# Altium footprint library Horizont_11_12_2017.PcbLib: 257 footprints (part 11 of 17)
Each footprint in its own frame and in the unit in brackets; x right, y up, seen from the top. Pads: shape width x height; smd on the part's side, far side on the other; paste and mask are expansions set on the pad; w line width, h text height; cw(c..) or ccw(c..) is an arc to the next point about the centre after c.
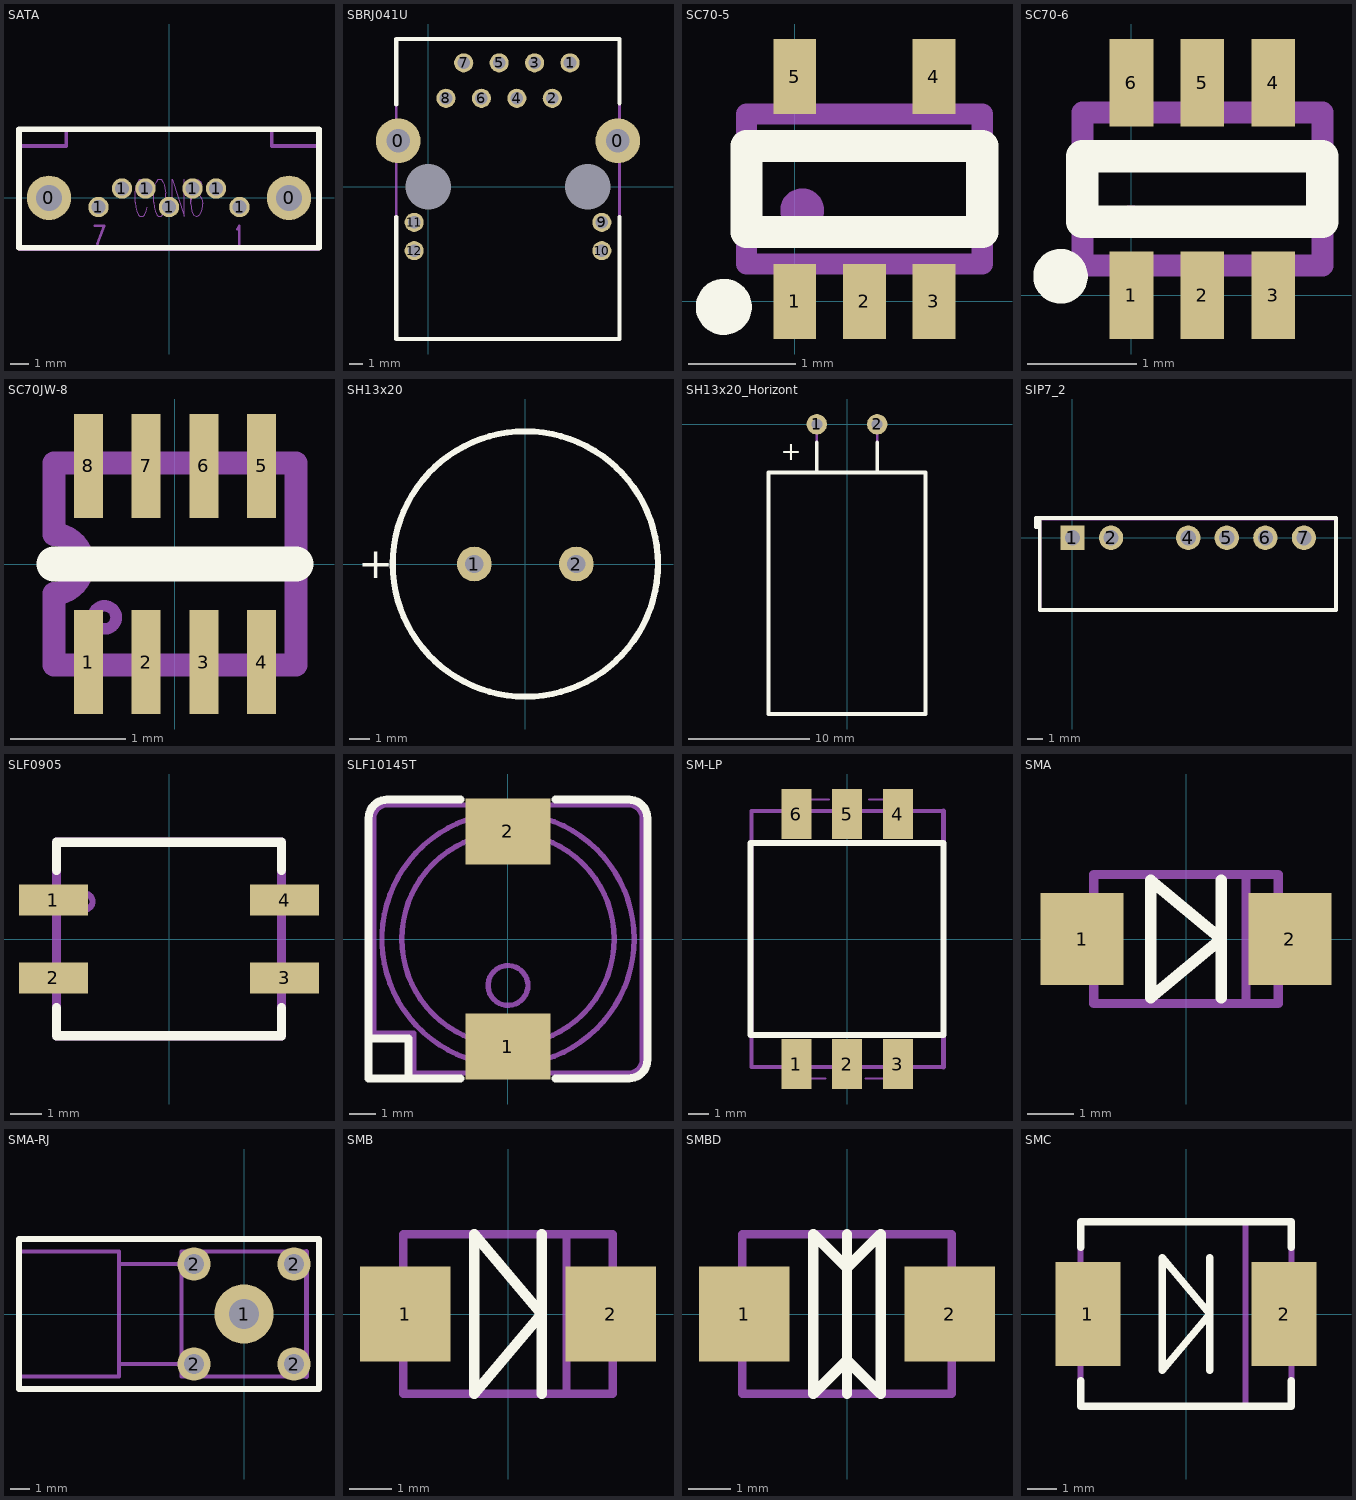
[diagram p10: the footprints below, top view; thin cyan lines are the x and y axes]

## SATA [mm]
height 8.4
pads (9):
  round 2.4 hole 1.4 mask+0.05: 0(-6.48,0) 0(6.48,0)
  round 1.1 hole 0.75 mask+0.05: 1(-3.81,-0.5) 1(-2.54,0.5) 1(-1.27,0.5) 1(0,-0.5) 1(1.27,0.5) 1(2.54,0.5) 1(3.81,-0.5)
Top Overlay:
  lines w0.3: -8.1,-2.7 -8.1,3.7 8.1,3.7 8.1,-2.7 -8.1,-2.7
Mechanical 1:
  lines w0.2: -8.1,-2.7 8.1,-2.7 8.1,2.8 5.548,2.8 5.548,3.7 3.15,3.7 -4.4,3.7 -5.552,3.7 -5.552,2.8 -5.553,2.8 -8.1,2.8 -8.1,-2.7
  text "7" at -4.08,0.7 h1.5
  text "1" at 3.82,0.5 h1.5
  text ".Designator" at -2.5,-2.8 h1.5
Mechanical 7:
  lines w0.05: -1.177,-0.516 -1.223,-0.728 -1.314,-0.91 -1.398,-1 -1.574,-1 -1.658,-0.91 -1.743,-0.728 -1.788,-0.516 -1.827,-0.243 -1.827,0.242 -1.788,0.515 -1.743,0.697 -1.658,0.878 -1.574,1 -1.398,1 -1.314,0.878 -1.223,0.697 -1.177,0.515 ; 0.173,-1 0.173,1 0.823,-1 0.823,1 ; 1.771,0.697 1.719,0.878 1.569,0.969 1.472,0.969 1.322,0.878 1.218,0.606 1.173,0.121 1.173,-0.334 ; 1.173,-0.334 1.218,-0.061 1.322,0.121 1.472,0.212 1.517,0.212 1.667,0.121 1.771,-0.061 1.823,-0.334 1.823,-0.455 1.771,-0.728 1.667,-0.91 1.517,-1 1.472,-1 1.322,-0.91 1.218,-0.728 1.173,-0.334 ; -0.827,-0.243 -0.788,-0.516 -0.749,-0.728 -0.665,-0.91 -0.587,-1 -0.424,-1 -0.346,-0.91 -0.262,-0.728 -0.223,-0.516 -0.177,-0.243 -0.177,0.242 -0.223,0.515 -0.262,0.697 -0.346,0.878 -0.424,1 -0.587,1 -0.665,0.878 -0.749,0.697 -0.788,0.515 -0.827,0.242 -0.827,-0.243
  lines w0.15: -4.012,-1.516 -3.492,-1.516 -3.867,-2.5 ; 3.691,-1.697 3.732,-1.652 3.795,-1.516 3.795,-2.5 ; -8.052,-2.8 8.048,-2.8 8.048,2.8 5.548,2.8 5.548,3.75 -5.552,3.75 -5.552,2.8 -8.052,2.8 -8.052,-2.8
3D body "SATA.stp": height 8, standoff -2.8, extent -8.04,-2.75 8.04,3.7

## SBRJ041U [mm]
height 13.5
pads (16):
  round 3.205 hole 1.7 mask+0.097: 0(-2.16,3.3) 0(13.59,3.3)
  round 0 hole 3.25 mask+2: 0(0,0)
  round 0.2 hole 3.25 mask+2: 0(11.43,0)
  round 1.372 hole 0.9 mask+0.051: 1(10.16,8.89) 2(8.89,6.35) 3(7.62,8.89) 4(6.35,6.35) 5(5.08,8.89) 6(3.81,6.35) 7(2.54,8.89) 8(1.27,6.35) 9(12.44,-2.54) 10(12.44,-4.57) 11(-1.01,-2.54) 12(-1.01,-4.57)
Top Overlay:
  lines w0.3: -2.287,-2.15 -2.287,-10.9 13.713,-10.9 13.713,-2.15 ; -2.287,5.9 -2.287,10.6 13.713,10.6 13.713,6
Mechanical 1:
  lines w0.2: -2.287,-10.9 13.713,-10.9 13.713,10.6 -2.287,10.6 -2.287,-10.9
  text "8" at -0.337,6 h1.5
  text "7" at 0.863,8.6 h1.5
  text "2" at 10.013,5.95 h1.5
  text "1" at 11.213,8.5 h1.5
  text ".Designator" at 3.363,-5.35 h1.5
3D body "SBRJ041U.STEP": height 13.02, standoff -4.01, extent -2.285,-10.9 13.715,10.6

## SC70-5 [mm]
height 1.1
pads (5):
  rect 0.4x0.7 smd: 1(0,0) 2(0.65,0) 3(1.3,0) 4(1.3,2.1) 5(0,2.1)
Top Overlay:
  circle w0.3: c-0.662,-0.05 r0.112
  lines w0.3: -0.45,0.65 -0.45,1.45 1.75,1.45 1.75,0.65 -0.45,0.65
Mechanical 1:
  circle w0.25: c0.07,0.85 r0.08
  lines w0.2: 0,-0.15 0,0.35 ; 0,1.75 0,2.25 ; 1.3,-0.15 1.3,0.35 ; 1.3,1.75 1.3,2.25 ; -0.45,0.35 1.75,0.35 1.75,1.75 -0.45,1.75 -0.45,0.35 ; 0.65,-0.15 0.65,0.35 0.65,-0.15
  text ".Designator" at -0.32,2.91 h1.5
  text ".Comment" at -2.02,-1.69 h1.5
  text "5" at -1.05,2.05 h1.5
3D body "DCK.stp": height 1.11, standoff 0, extent -0.45,-0.25 1.75,2.35

## SC70-6 [mm]
height 0.9
pads (6):
  rect 0.4x0.8 smd: 1(0,0) 2(0.65,0) 3(1.3,0) 4(1.3,1.95) 5(0.65,1.95) 6(0,1.95)
Top Overlay:
  circle w0.3: c-0.65,0.175 r0.1
  lines w0.3: -0.45,0.675 1.75,0.675 1.75,1.275 -0.45,1.275 -0.45,0.675
Mechanical 1:
  circle w0.2: c0,0.675 r0.05
  lines w0.2: 0,-0.225 0,0.275 ; 0,1.675 0,2.175 ; 0.65,-0.225 0.65,0.275 ; 0.65,1.675 0.65,2.175 ; 1.3,-0.225 1.3,0.275 ; 1.3,1.675 1.3,2.175 ; -0.45,0.275 -0.45,1.675 1.75,1.675 1.75,0.275 -0.45,0.275
  text "6" at -1.05,1.975 h1.5
  text ".Comment" at -1.89,-1.62 h1.5
  text ".Designator" at -0.09,2.65 h1.5
3D body "KS6h09.stp": height 0.91, standoff 0, extent -0.45,-0.13 1.75,2.07

## SC70JW-8 [mm]
height 1.1
pads (8):
  rect 0.25x0.9 smd: 1(-0.75,-0.85) 2(-0.25,-0.85) 3(0.25,-0.85) 4(0.75,-0.85) 5(0.75,0.85) 6(0.25,0.85) 7(-0.25,0.85) 8(-0.75,0.85)
Top Overlay:
  lines w0.3: -1.05,0 1.05,0
Mechanical 1:
  circle w0.1: c-0.61,-0.463 r0.1
  lines w0.2: -1.05,-0.875 -1.05,-0.254 ccw(c-1.05,0) -1.05,0.254 -1.05,0.875 1.05,0.875 1.05,-0.875 -1.05,-0.875
  text ".Designator" at -0.3,1.35 h1.5
  text "8" at -1.25,1.2 h1.5
3D body "SC70JW-8.STEP": height 1.1, standoff 0, extent -1.1,-1.15 1.1,1.15

## SH13x20 [mm]
height 20
pads (2):
  round 1.7 hole 0.9: 1(-2.5,0) 2(2.5,0)
Top Overlay:
  circle w0.3: c0,0 r6.5
  text "+" at -8.2,-0.7 h1.5
Mechanical 1:
  circle w0.2: c0,0 r6.5
  text ".Designator" at -1.27,2.54 h1.5
  text "+" at -2.9,-0.5 h1.5
3D body "SH13x20.STEP": height 20, standoff -3, extent -6.5,-6.5 6.5,6.5

## SH13x20_Horizont [mm]
height 13
pads (2):
  round 1.7 hole 0.9: 1(-2.5,0) 2(2.5,0)
Top Overlay:
  lines w0.3: -2.5,-4 -2.5,-1.5 ; 2.5,-4 2.5,-1.5 ; -6.5,-24 6.5,-24 6.5,-4 -6.5,-4 -6.5,-24
  text "+" at -5.5,-3 h1.5
Mechanical 1:
  lines w0.2: -2.5,-4 -2.5,0 ; 2.5,-4 2.5,0 ; -6.5,-24 -6.5,-4 6.5,-4 6.5,-24 -6.5,-24
  text ".Designator" at -2,-8 h1.5
  text "+" at -3,-5.5 h1.5
3D body "SH13x20_Horizont.STEP": height 13, standoff -3, extent -6.5,-24 6.5,0.3

## SIP7_2 [mm]
height 10
pads (6):
  rect 1.6x1.6 hole 1: 1(0,0)
  round 1.6 hole 1: 2(2.54,0) 4(7.62,0) 5(10.16,0) 6(12.7,0) 7(15.24,0)
Top Overlay:
  lines w0.25: -2.15,0.7 -2.4,0.7 -2.4,1.3 -2,1.3 ; -2.15,-4.75 -2.15,1.3 -0.1,1.3 17.35,1.3 17.35,-4.75 -2.15,-4.75
Mechanical 1:
  lines w0.2: -2.15,-4.75 -2.15,1.25 17.35,1.25 17.35,-4.75 -2.15,-4.75
  text "1" at -0.2,-0.4 h1.5
  text "7" at 15.24,-0.381 h1.5
  text ".Comment" at 5.15,-3.7 h1.5
  text ".Designator" at 4.5,-2.1 h1.5
3D body "SIP7_2.stp": height 10, standoff -3, extent -2.15,-4.75 17.35,1.25

## SLF0905 [mm]
height 5.55
pads (4):
  rect 2.2x1 smd: 1(-3.7,1.245) 2(-3.7,-1.245) 3(3.7,-1.245) 4(3.7,1.245)
Top Overlay:
  lines w0.3: -3.6,-2.2 -3.6,-3.1 3.6,-3.1 3.6,-2.2 ; -3.6,2.2 -3.6,3.1 3.6,3.1 3.6,2.2
Mechanical 1:
  circle w0.2: c-2.7,1.197 r0.254
  lines w0.3: -4.6,-1.2 -3.6,-1.2 ; -4.6,1.2 -3.6,1.2 ; 3.6,-1.2 4.6,-1.2 ; 3.6,1.2 4.6,1.2 ; -3.6,-3.1 3.6,-3.1 3.6,3.1 -3.6,3.1 -3.6,-3.1
  text ".Designator" at -1.5,0.2 h1.5
  text ".Comment" at -2.21,-1.92 h1.5
3D body "SLF0905.stp": height 5.65, standoff 0.1, extent -4.595,-3.1 4.595,3.1

## SLF10145T [mm]
height 5
pads (2):
  rect 3.2x2.5 smd: 1(0,-4.05) 2(0,4.05)
Top Overlay:
  lines w0.3: -5.25,-3.75 -3.75,-3.75 -3.75,-5.25 ; -1.794,-5.25 -5.25,-5.25 -5.25,4.55 cw(c-4.55,4.55) -4.55,5.25 -1.794,5.25 ; 1.794,-5.25 4.55,-5.25 ccw(c4.55,-4.55) 5.25,-4.55 5.25,4.55 ccw(c4.55,4.55) 4.55,5.25 1.794,5.25
Mechanical 1:
  circle w0.2: c0,0 r4.75
  circle w0.2: c0,0 r4
  circle w0.2: c0,-1.75 r0.75
  lines w0.2: -5.05,-3.55 -5.05,4.55 cw(c-4.55,4.55) -4.55,5.05 4.55,5.05 cw(c4.55,4.55) 5.05,4.55 5.05,-4.55 cw(c4.55,-4.55) 4.55,-5.05 -3.55,-5.05 -3.55,-3.55 -5.05,-3.55
  text ".Comment" at -1.35,-0.2 h1.5
  text ".Designator" at -2,1.4 h1.5
3D body "SLF10145T.stp": height 5.06, standoff 0, extent -5,-5 5,5

## SM-LP [mm]
height 7.36
pads (6):
  rect 1.5x2.5 smd: 1(-2.54,-6.25) 2(0,-6.25) 3(2.54,-6.25) 4(2.54,6.25) 5(0,6.25) 6(-2.54,6.25)
Top Overlay:
  lines w0.3: -4.83,-4.8 4.81,-4.8 4.81,4.8 -4.83,4.8 -4.83,-4.8
Mechanical 1:
  circle w0.1: c-2.55,-5.8 r0.1
  lines w0.1: -2.59,-6.98 -1.09,-6.98 ; -2.51,6.98 -0.91,6.98 ; -0.24,-7 0.014,-7 ; -0.014,7 0.24,7 ; 0.91,-6.98 2.51,-6.98 ; 1.09,6.98 2.59,6.98
  lines w0.2: -2.59,-6.98 -2.59,-6.4 ; -2.51,6.4 -2.51,6.98 ; 2.51,-6.98 2.51,-6.4 ; 2.59,6.4 2.59,6.98 ; 4.81,-6.4 -4.79,-6.4 -4.79,6.4 4.81,6.4
  lines w0.25: 4.81,-6.4 4.81,6.4
  text "6" at -2.7,5.15 h1.5
  text ".Comment" at -2.75,-2.25 h1.5
  text ".Designator" at -1.75,1.5 h1.5
3D body "SM-LP.STEP": height 5.02, standoff 0, extent -4.8,-7 4.8,7

## SMA [mm]
height 2.2
pads (2):
  rect 1.8x2 smd: 1(-2.25,0) 2(2.25,0)
Top Overlay:
  lines w0.25: 0.762,-1.27 0.762,1.27 ; -0.762,-1.27 0.762,0 -0.762,1.27 -0.762,-1.27
Mechanical 1:
  lines w0.2: -2,-0.8 -2.7,-0.8 -2.7,0.8 -2,0.8 ; 1.3,-1.27 1.3,1.27 ; 2,-0.8 2.7,-0.8 2.7,0.8 2,0.8 ; -2,-1.4 2,-1.4 2,1.4 -2,1.4 -2,-1.4
  text "+" at -1.338,0.108 h1.5
  text ".Designator" at -1.3,1.8 h1.5
3D body "SMA.stp": height 2.2, standoff 0, extent -2.8,-1.5 2.8,1.5

## SMA-RJ [mm]
height 9.9
pads (5):
  round 3 hole 1.5: 1(0,0)
  round 1.7 hole 1: 2(-2.54,-2.54) 2(-2.54,2.54) 2(2.54,-2.54) 2(2.54,2.54)
Top Overlay:
  lines w0.3: -11.43,-3.81 -11.43,3.81 3.81,3.81 3.81,-3.81 -11.43,-3.81
Mechanical 1:
  lines w0.2: -6.35,-2.54 -3.175,-2.54 ; -6.35,2.54 -3.175,2.54 ; 3.175,-3.175 -3.175,-3.175 -3.175,3.175 3.175,3.175 ; -11.43,-3.175 -6.35,-3.175 -6.35,3.175 -11.43,3.175 -11.43,-3.175
  lines w0.25: 3.175,-3.175 3.175,3.175
  text ".Designator" at -1.05,0.51 h1.5
  text ".Comment" at -1.27,-4.445 h1.5
3D body "SW3dPS-sma ra pcb mount molex.STEP": height 9.55, standoff -3.94, extent -11.633,-3.175 3.175,3.175

## SMB [mm]
height 2.44
pads (2):
  rect 2.16x2.26 smd: 1(-2.45,0) 2(2.45,0)
Top Overlay:
  lines w0.25: 0.8,-1.9 0.8,1.9 ; -0.8,-1.9 0.8,0 -0.8,1.9 -0.8,-1.9
Mechanical 1:
  lines w0.2: -2.5,-1.016 -3,-1.016 -3,1.016 -2.5,1.016 ; 1.397,-1.778 1.397,1.778 ; 2.5,-1.016 3,-1.016 3,1.016 2.5,1.016 ; -2.5,-1.9 2.5,-1.9 2.5,1.9 -2.5,1.9 -2.5,-1.9
  text "+" at -1.238,0.008 h1.5
  text ".Designator" at -1.4,2.5 h1.5
3D body "SMB.stp": height 2.4, standoff 0, extent -3,-1.9 3,1.91

## SMBD [mm]
height 2.44
pads (2):
  rect 2.16x2.26 smd: 1(-2.45,0) 2(2.45,0)
Top Overlay:
  lines w0.25: 0,-1.9 0,1.9 ; 0,-1.1 0.8,-1.9 0.8,1.9 0,1.1 ; 0,-1.1 0,0 0,1.1 ; 0,-1.1 -0.8,-1.9 -0.8,1.9 0,1.1
Mechanical 1:
  lines w0.2: -2.5,-1.016 -3,-1.016 -3,1.016 -2.5,1.016 ; 2.5,-1.016 3,-1.016 3,1.016 2.5,1.016 ; -2.5,-1.9 -2.5,1.9 2.5,1.9 2.5,-1.9 -2.5,-1.9
  text ".Designator" at -1.4,2.5 h1.5
  text "+" at -1.238,0.008 h1.5
3D body "SMB.stp": height 2.4, standoff 0, extent -3,-1.9 3,1.91

## SMC [mm]
height 2.62
pads (2):
  rect 2.2x3.5 smd: 1(-3.3,0) 2(3.3,0)
Top Overlay:
  lines w0.25: -3.55,-2.25 -3.55,-3.1 3.55,-3.1 3.55,-2.25 ; -3.55,2.25 -3.55,3.1 3.55,3.1 3.55,2.25 ; 0.8,-1.9 0.8,1.9 ; -0.8,-1.9 0.8,0 -0.8,1.9 -0.8,-1.9
Mechanical 1:
  lines w0.2: -3.55,-1.55 -4.05,-1.55 -4.05,1.55 -3.55,1.55 ; 1.996,3.1 2,-3.1 ; 3.55,-1.55 4.05,-1.55 4.05,1.55 3.55,1.55 ; -3.55,-3.1 3.55,-3.1 3.55,3.1 -3.55,3.1 -3.55,-3.1
  text "+" at -1.988,0.008 h1.5
  text ".Designator" at -0.748,0.128 h1.5
3D body "SMC.stp": height 2.62, standoff 0, extent -4.05,-3.1 4.08,3.12